# Altium footprint library IoWLabs.PcbLib: 55 footprints (part 2 of 4)
Each footprint in its own frame and in the unit in brackets; x right, y up, seen from the top. Pads: shape width x height; smd on the part's side, far side on the other; paste and mask are expansions set on the pad; w line width, h text height; cw(c..) or ccw(c..) is an arc to the next point about the centre after c.
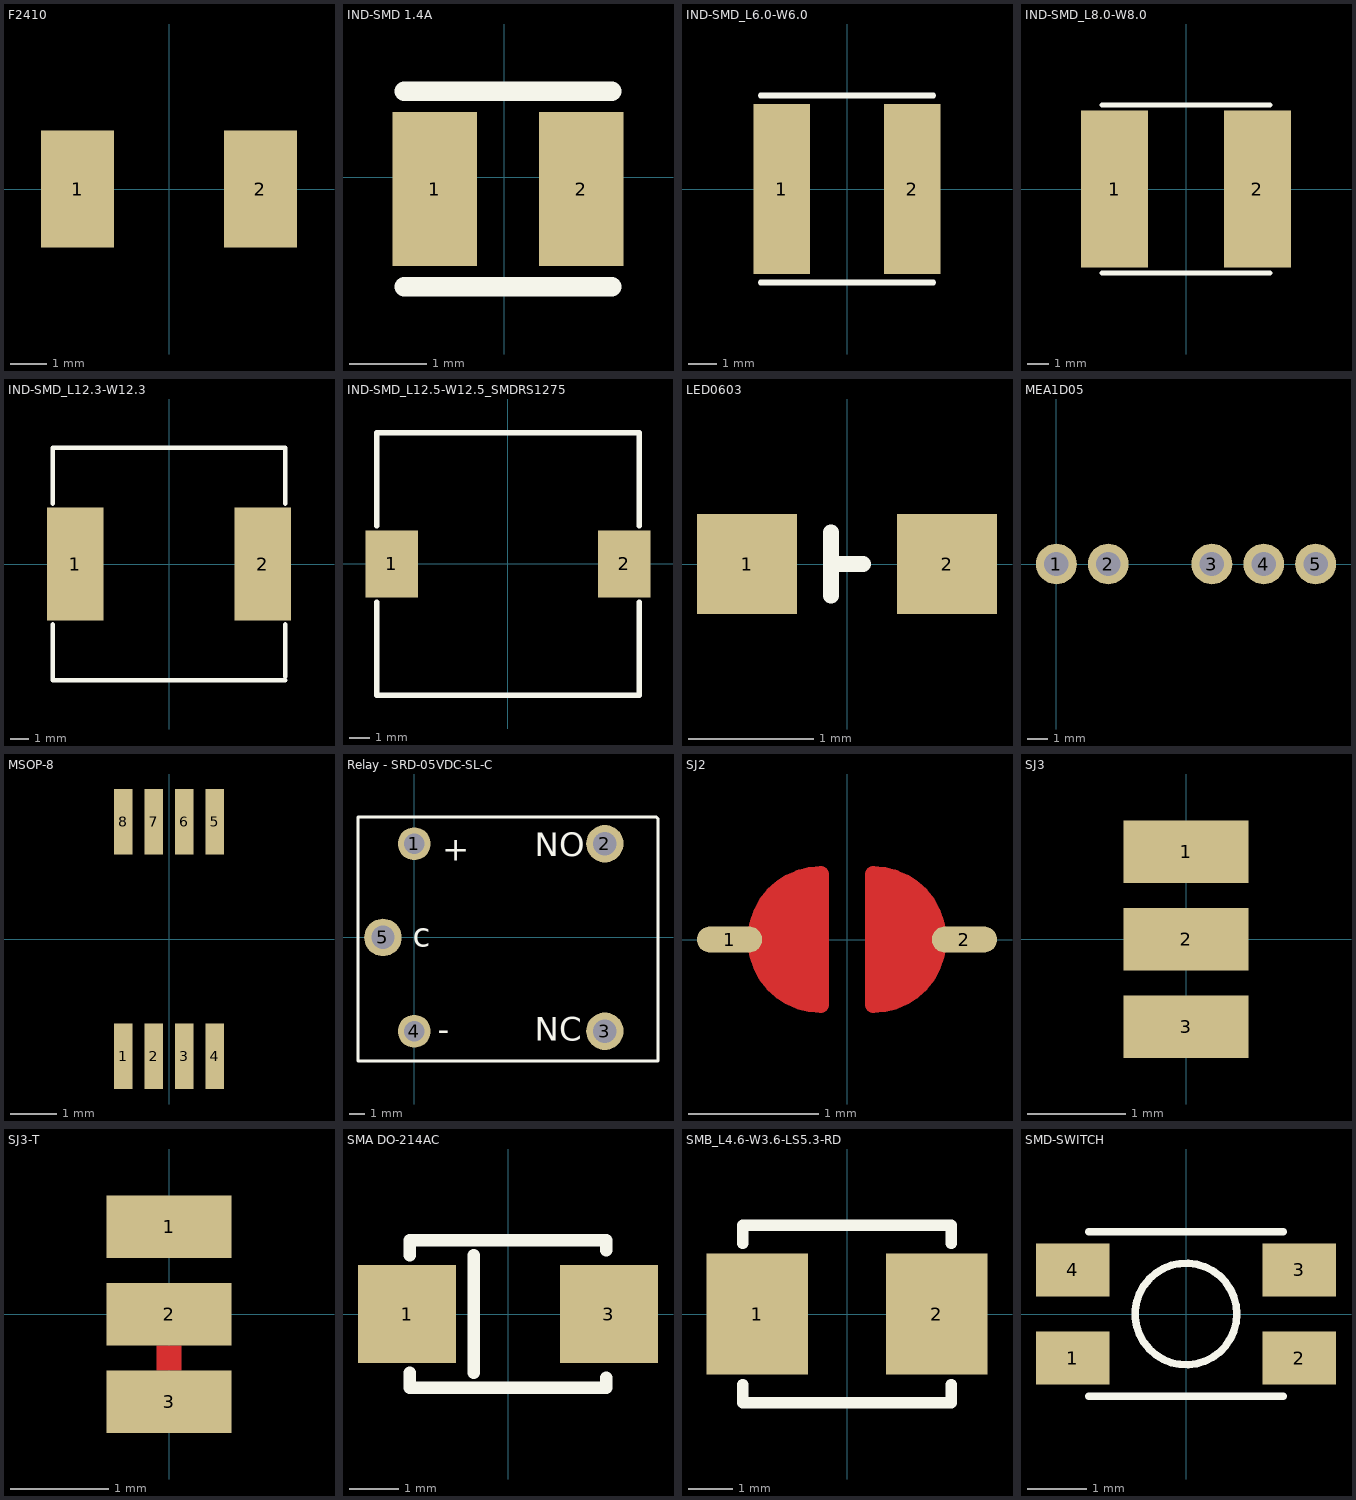
[diagram p1: the footprints below, top view; thin cyan lines are the x and y axes]

## F2410 [mm] "Fuse SMD"
pads (2):
  rect 2x3.2 smd: 1(-2.5,0) 2(2.5,0)
3D body "0679H1000-xx.stp": height 2.58, standoff 0.04, extent -3.05,-1.245 3.05,1.295

## IND-SMD 1.4A [mm] "4.7uH ±20% 3.5A 70mO SMD,6.6x7.2x2.0mm Inductors (SMD) RoHS"
pads (2):
  rect 1.1x2 smd: 1(-0.901,-0.152) 2(1,-0.152)
Top Overlay:
  lines w0.254: -1.301,-1.422 1.399,-1.422 ; -1.301,1.118 1.399,1.118
Mechanical 15:
  lines w0.003: 1.104,-0.05 1.154,0
3D body "DFE252012PD-3R3M=P2.STEP": height 1, standoff -1, extent -1.3,-0.7 1.2,0.5

## IND-SMD_L6.0-W6.0 [mm]
pads (2):
  rect 2x6 smd: 1(-2.3,0) 2(2.3,0)
Top Overlay:
  lines w0.2: -3.048,-3.302 3.048,-3.302 ; -3.048,3.302 3.048,3.302
3D body "pcsn5d33_l6_w6_h3-5.stp": height 3.55, standoff 0, extent -3,-3 3,3

## IND-SMD_L8.0-W8.0 [mm]
pads (2):
  rect 3.2x7.5 smd: 1(-3.4,0) 2(3.4,0)
Top Overlay:
  lines w0.254: -4,-4 4,-4 ; -4,4 4,4
3D body "ASPI-8040S.STEP": height 4, standoff 0, extent -4.1,-4 3.9,4

## IND-SMD_L12.3-W12.3 [mm]
pads (2):
  rect 3x6 smd: 1(-5,0) 2(5,0)
Top Overlay:
  lines w0.254: -6.2,-3.231 -6.2,-6.2 6.2,-6.2 ; -6.2,3.231 -6.2,6.2 6.2,6.2 6.2,3.231 ; 6.2,-6 6.2,-3.231
3D body "IND_CDRH127LDNP-470MC_SUM.step": height 8, standoff 0, extent -6.094,-6.1 6.2,6.198

## IND-SMD_L12.5-W12.5_SMDRS1275 [mm]
pads (2):
  rect 2.5x3.2 smd: 1(-5.55,0) 2(5.55,0)
Top Overlay:
  lines w0.254: -6.25,-1.831 -6.25,-6.25 6.25,-6.25 6.25,-1.831 ; -6.25,1.831 -6.25,6.25 6.25,6.25 6.25,1.831
3D body "69730.stp": height 7.8, standoff -0.2, extent -6.25,-6.25 6.25,6.25

## LED0603 [mm] "LED 0603"
pads (2):
  rect 0.8x0.8 smd: 1(-0.8,0) 2(0.8,0)
Top Overlay:
  lines w0.127: -0.127,-0.254 -0.127,0.254 ; -0.127,0 0.127,0
3D body "LED Green SMD 0603 Würth 150060BS55040.stp": height 0.4, standoff 0, extent -0.8,-0.4 0.8,0.4

## MEA1D05 [mm]
pads (5):
  round 2 hole 1.2: 1(0,0) 2(2.54,0) 3(7.62,0) 4(10.16,0) 5(12.7,0)
3D body "SIP-5(7)_A6.step": height 10.17, standoff -2.24, extent -2.03,-4.572 17.27,1.518

## MSOP-8 [mm]
pads (8):
  rect 0.4x1.4 smd: 1(-0.975,-2.502) 2(-0.325,-2.502) 3(0.325,-2.502) 4(0.975,-2.502) 5(0.975,2.502) 6(0.325,2.502) 7(-0.325,2.502) 8(-0.975,2.502)
3D body "msop-8.SLDPRT": height 1.15, standoff 0, extent -1.5,-2.45 1.5,2.45

## Relay - SRD-05VDC-SL-C [mm] "SRD-05VDC-SL-C, Through Hole"
pads (5):
  round 2.1 hole 1.3: 1(0,6) 4(0,-6)
  round 2.4 hole 1.5: 2(12.2,6) 3(12.2,-6) 5(-2,0)
Top Overlay:
  lines w0.2: -3.6,-7.9 -3.6,7.7 15.5,7.7 15.6,7.6 15.6,-7.9 -3.6,-7.9
  text "+" at 1.8,4.9 h1.52
  text "-" at 1.5,-6.6 h1.52
  text "NO" at 7.7,5.2 h1.52
  text "NC" at 7.7,-6.6 h1.52
  text "c" at -0.1,-0.6 h1.52
3D body "RELAY_SRD-05VCD.STEP": height 15.9, standoff -2.8, extent -3.6,-7.9 15.6,7.7

## SJ2 [mm]
pads (2):
  oval 0.5x0.2 smd: 1(-0.9,0) 2(0.9,0)
Top Layer:
  region: 0.2,-0.5 0.299,-0.5 0.483,-0.424 0.624,-0.283 0.7,-0.099 0.7,0.099 0.624,0.283 0.483,0.424 0.299,0.5 0.2,0.5
  region: -0.238,-0.491 -0.338,-0.491 -0.521,-0.415 -0.662,-0.275 -0.738,-0.091 -0.738,0.108 -0.662,0.292 -0.521,0.433 -0.338,0.509 -0.238,0.509
  lines w0.127: -0.2,-0.5 cw(c-0.2,0) -0.2,0.5 -0.2,-0.5 ; 0.2,-0.5 ccw(c0.2,0) 0.2,0.5 0.2,-0.5
Top Solder:
  region: 0.2,-0.5 0.299,-0.5 0.483,-0.424 0.624,-0.283 0.7,-0.099 0.7,0.099 0.624,0.283 0.483,0.424 0.299,0.5 0.2,0.5
  region: -0.238,-0.491 -0.338,-0.491 -0.521,-0.415 -0.662,-0.275 -0.738,-0.091 -0.738,0.108 -0.662,0.292 -0.521,0.433 -0.338,0.509 -0.238,0.509

## SJ3 [mil] "Solder Jumper 3 pos"
pads (3):
  rect 50x25 smd: 1(0,35) 2(0,0) 3(0,-35)

## SJ3-T [mil] "Solder Jumper 3 pos"
pads (3):
  rect 50x25 smd: 1(0,35) 2(0,0) 3(0,-35)
Top Layer:
  rectangle: -5,-22.5 5,-12.5

## SMA DO-214AC [mm]
pads (2):
  rect 2x2 smd: 1(-2.057,0) 3(2.057,0)
Top Overlay:
  lines w0.254: -2,-1.2 -2,-1.5 2,-1.5 2,-1.3 ; -2,1.2 -2,1.5 2,1.5 2,1.3 ; -0.7,-1.2 -0.7,1.2
3D body "DO-214AC (SMA).step": height 1.96, standoff 0.01, extent -2.555,-1.35 2.555,1.35

## SMB_L4.6-W3.6-LS5.3-RD [mm]
pads (2):
  rect 2.29x2.72 smd: 1(-2.025,0) 2(2.025,0)
Top Overlay:
  lines w0.254: -2.35,-1.591 -2.35,-2 2.35,-2 2.35,-1.591 ; -2.35,1.591 -2.35,2 2.35,2 2.35,1.591
3D body "SMB.STEP": height 2.5, standoff 0, extent -2.795,-1.97 2.795,1.97

## SMD-SWITCH [mm]
pads (4):
  rect 1.25x0.9 smd: 1(-1.925,-0.75) 2(1.925,-0.75) 3(1.925,0.75) 4(-1.925,0.75)
Top Overlay:
  circle w0.127: c0,0 r0.864
  lines w0.127: -1.651,-1.397 1.651,-1.397 ; -1.651,1.397 1.651,1.397
3D body "KMR621NG LFS.step": height 1.9, standoff 0, extent -2.29,-1.39 2.306,1.39